# Altium footprint library First Board IMX6.PcbLib: 204 footprints (part 9 of 13)
Each footprint in its own frame and in the unit in brackets; x right, y up, seen from the top. Pads: shape width x height; smd on the part's side, far side on the other; paste and mask are expansions set on the pad; w line width, h text height; cw(c..) or ccw(c..) is an arc to the next point about the centre after c.
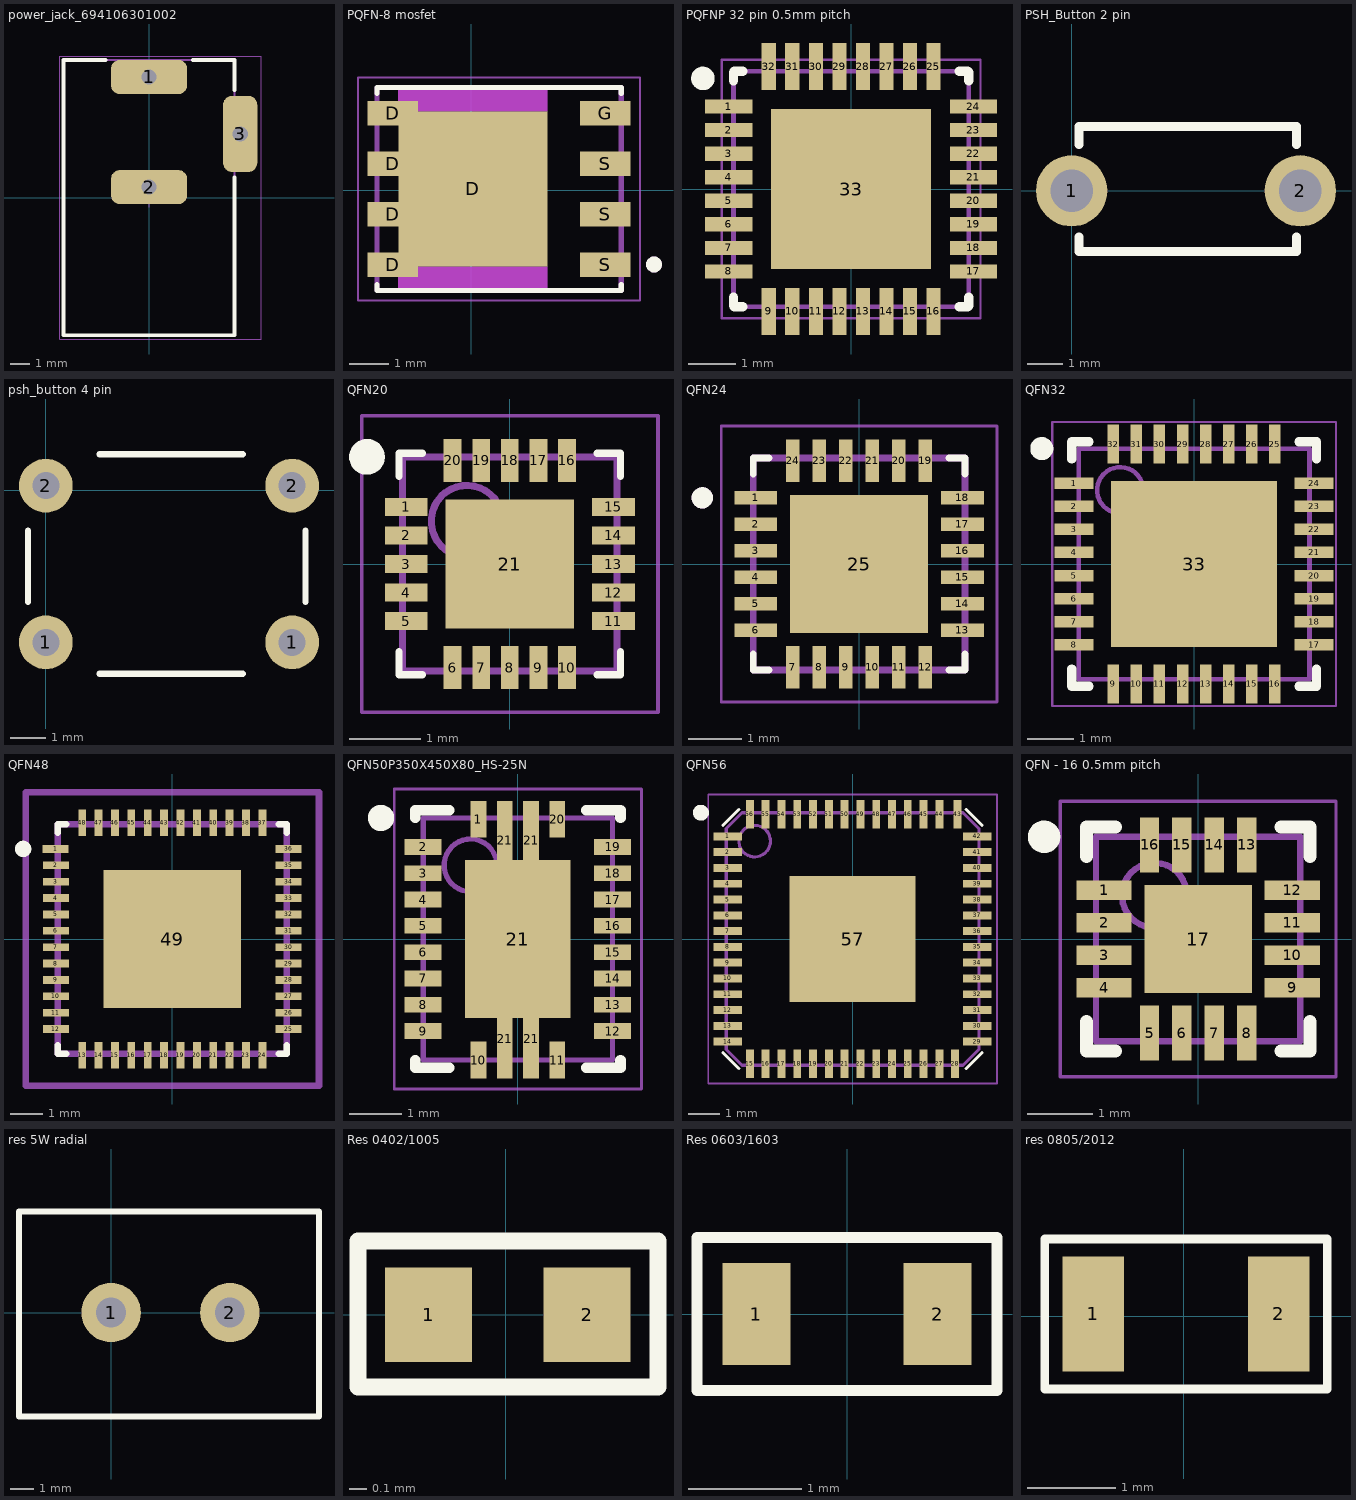
[diagram p8: the footprints below, top view; thin cyan lines are the x and y axes]

## power_jack_694106301002 [mm]
pads (3):
  rrect50% 4x1.8 hole 0.8 square: 1(0,6.35) 2(0,0.55)
  rrect50% 1.8x4 hole 0.8 square: 3(4.8,3.35)
Top Overlay:
  lines w0.2: -2.3,7.25 -4.5,7.25 -4.5,-7.25 4.5,-7.25 4.5,1.05 ; 2.3,7.25 4.5,7.25 4.5,5.65
Mechanical 11:
  lines w0.1: -4.5,-7.25 4.5,-7.25 4.5,7.25 -4.5,7.25 -4.5,-7.25
  text ".Designator" at -1.75,-0.75 h1.5
Mechanical 13:
  lines w0.1: -4.5,-7.25 -4.5,7.25 4.5,7.25 4.5,-7.25 -4.5,-7.25
Mechanical 15:
  lines w0.05: -0.5,0 0.5,0 ; 0,-0.5 0,0.5 ; -4.7,-7.45 5.9,-7.45 5.9,7.45 -4.7,7.45 -4.7,-7.45
3D body "694106301002.stp": height 10.75, standoff -3.75, extent -4.5,-7.25 5,7.25

## PQFN-8 mosfet [mm]
pads (9):
  rect 1.27x0.61 smd: D(-1.97,-1.878) D(-1.97,-0.608) D(-1.97,0.662) D(-1.97,1.932) G(3.37,1.932) S(3.37,-1.878) S(3.37,-0.608) S(3.37,0.662)
  rect 3.75x3.91 smd: D(0.04,0.027)
Top Overlay:
  circle w0.2: c4.6,-1.873 r0.1
  lines w0.127: -2.375,-2.373 -2.375,-2.523 3.775,-2.523 3.775,-2.373 ; -2.375,2.427 -2.375,2.577 3.775,2.577 3.775,2.427
Keep-Out Layer:
  region: -1.335,-1.931 1.912,-1.931 1.912,-2.523 -1.335,-2.523
  region: -1.835,-2.174 -1.331,-2.174 -1.331,-2.523 -1.835,-2.523
  region: -1.335,2.581 1.917,2.581 1.917,1.982 -1.335,1.982
  region: -1.84,2.589 -1.336,2.589 -1.336,2.237 -1.84,2.237
Mechanical 13:
  circle w0.2: c4.6,-1.873 r0.1
  lines w0.127: -2.375,-2.523 3.775,-2.523 3.775,2.577 -2.375,2.577 -2.375,-2.523
Mechanical 15:
  region: -1.335,-1.929 1.91,-1.929 1.91,-2.523 -1.335,-2.523
  region: -1.835,-2.174 -1.331,-2.174 -1.331,-2.523 -1.835,-2.523
  region: -1.335,2.58 1.916,2.58 1.916,1.982 -1.335,1.982
  region: -1.84,2.589 -1.336,2.589 -1.336,2.237 -1.84,2.237
  lines w0.05: -2.85,-2.773 4.25,-2.773 4.25,2.827 -2.85,2.827 -2.85,-2.773
3D body "PQFN-8.step": height 1.1, standoff 0, extent -2.4,-2.6 3.85,2.6

## PQFNP 32 pin 0.5mm pitch [mm] "PQFN, 32-Leads, Body 5,00x5,00mm, Pitch 0,50mm, Thermal Pad 3,80x3,80mm, IPC Medium Density"
height 1
pads (33):
  rect 1x0.3 smd: 1(-2.6,1.75) 2(-2.6,1.25) 3(-2.6,0.75) 4(-2.6,0.25) 5(-2.6,-0.25) 6(-2.6,-0.75) 7(-2.6,-1.25) 8(-2.6,-1.75) 17(2.6,-1.75) 18(2.6,-1.25) 19(2.6,-0.75) 20(2.6,-0.25) 21(2.6,0.25) 22(2.6,0.75) 23(2.6,1.25) 24(2.6,1.75)
  rect 0.3x1 smd: 9(-1.75,-2.6) 10(-1.25,-2.6) 11(-0.75,-2.6) 12(-0.25,-2.6) 13(0.25,-2.6) 14(0.75,-2.6) 15(1.25,-2.6) 16(1.75,-2.6) 25(1.75,2.6) 26(1.25,2.6) 27(0.75,2.6) 28(0.25,2.6) 29(-0.25,2.6) 30(-0.75,2.6) 31(-1.25,2.6) 32(-1.75,2.6)
  rect 3.4x3.4 smd: 33(0,0)
Top Overlay:
  circle w0.25: c-3.15,2.35 r0.125
  lines w0.2: -2.5,-2.3 -2.5,-2.48 -2.48,-2.5 -2.3,-2.5 ; -2.5,2.3 -2.5,2.48 -2.48,2.5 -2.3,2.5 ; 2.3,-2.5 2.48,-2.5 2.5,-2.48 2.5,-2.3 ; 2.3,2.5 2.48,2.5 2.5,2.48 2.5,2.3
Mechanical 13:
  lines w0.1: -2.5,-2.48 -2.5,2.48 -2.48,2.5 2.48,2.5 2.5,2.48 2.5,-2.48 2.48,-2.5 -2.48,-2.5 -2.5,-2.48
Mechanical 15:
  lines w0.05: -2.75,-2.75 2.75,-2.75 2.75,2.75 -2.75,2.75 -2.75,-2.75
  lines w0.1: -0.5,0 0.5,0 ; 0,-0.5 0,0.5
3D body "UFQFPN-32.step": height 0.55, standoff 0, extent -2.5,-2.5 2.5,2.5

## PSH_Button 2 pin [mm]
pads (2):
  round 2 hole 1.2 mask+0.1: 1(0,0) 2(6.4,0)
Top Overlay:
  lines w0.254: 0.2,-1.3 0.2,-1.7 6.3,-1.7 6.3,-1.3 ; 0.2,1.3 0.2,1.8 6.3,1.8 6.3,1.3

## psh_button 4 pin [mil]
pads (4):
  round 60 hole 30: 1(0,-170) 1(275,-170) 2(0,5) 2(275,5)
Top Overlay:
  lines w7: -20,-125 -20,-45 ; 60,-205 220,-205 ; 60,40 220,40 ; 290,-125 290,-45
3D body "Psh_Button.step": height 98.43, standoff -314.96, extent -20.51,-204.1 290.51,40

## QFN20 [mm] "QFN, 20-Leads, Body 3,00x3,00mm, Pitch 0,40mm, Thermal Pad 1,80x1,80mm, IPC Medium Density"
height 0.8
pads (21):
  rect 0.6x0.25 smd: 1(-1.45,0.8) 2(-1.45,0.4) 3(-1.45,0) 4(-1.45,-0.4) 5(-1.45,-0.8) 11(1.45,-0.8) 12(1.45,-0.4) 13(1.45,0) 14(1.45,0.4) 15(1.45,0.8)
  rect 0.25x0.6 smd: 6(-0.8,-1.45) 7(-0.4,-1.45) 8(0,-1.45) 9(0.4,-1.45) 10(0.8,-1.45) 16(0.8,1.45) 17(0.4,1.45) 18(0,1.45) 19(-0.4,1.45) 20(-0.8,1.45)
  rect 1.8x1.8 smd: 21(0,0)
Top Overlay:
  circle w0.25: c-2,1.5 r0.125
  lines w0.1: -1.55,-1.225 -1.55,-1.55 -1.225,-1.55 ; -1.55,1.225 -1.55,1.55 -1.225,1.55 ; 1.225,-1.55 1.55,-1.55 1.55,-1.225 ; 1.225,1.55 1.55,1.55 1.55,1.225
Top Assembly:
  circle w0.1: c-0.6,0.6 r0.5
  lines w0.1: -1.5,-1.5 -1.5,1.5 1.5,1.5 1.5,-1.5 -1.5,-1.5
Top Courtyard:
  lines w0.05: -2.075,-2.075 -2.075,2.075 2.075,2.075 2.075,-2.075 -2.075,-2.075
  lines w0.1: -0.5,0 0.5,0 ; 0,-0.5 0,0.5
3D body "QFN-20-1EP_3x3mm_P0.45mm_EP1.6x1.6mm.step": height 0.6, standoff 0, extent -1.5,-1.5 1.5,1.5

## QFN24 [mm]
pads (25):
  rect 0.81x0.26 smd: 1(-1.95,1.25) 2(-1.95,0.75) 3(-1.95,0.25) 4(-1.95,-0.25) 5(-1.95,-0.75) 6(-1.95,-1.25) 13(1.95,-1.25) 14(1.95,-0.75) 15(1.95,-0.25) 16(1.95,0.25) 17(1.95,0.75) 18(1.95,1.25)
  rect 0.26x0.81 smd: 7(-1.25,-1.95) 8(-0.75,-1.95) 9(-0.25,-1.95) 10(0.25,-1.95) 11(0.75,-1.95) 12(1.25,-1.95) 19(1.25,1.95) 20(0.75,1.95) 21(0.25,1.95) 22(-0.25,1.95) 23(-0.75,1.95) 24(-1.25,1.95)
  rect 2.6x2.6 smd paste-2: 25(0,0)
Top Overlay:
  circle w0.2: c-2.96,1.25 r0.1
  lines w0.127: -2,-1.7 -2,-2 -1.7,-2 ; -2,1.7 -2,2 -1.7,2 ; 1.7,-2 2,-2 2,-1.7 ; 1.7,2 2,2 2,1.7
Top Paste:
  region: 0.82,-0.82 -0.82,-0.82 -0.82,0.82 0.82,0.82
Mechanical 13:
  circle w0.2: c-2.96,1.25 r0.1
  lines w0.127: -2,-2 2,-2 2,2 -2,2 -2,-2
Mechanical 15:
  lines w0.05: -2.605,-2.605 2.605,-2.605 2.605,2.605 -2.605,2.605 -2.605,-2.605
3D body "QFN 24 4x4.step": height -0.4, standoff -1.3, extent -2.002,-2.002 2.002,2.002

## QFN32 [mm] "QFN, 32-Leads, Body 5,00x5,00mm, Pitch 0,50mm, Thermal Pad 3,60x3,60mm, IPC Medium Density"
height 0.8
pads (33):
  rect 0.85x0.25 smd: 1(-2.6,1.75) 2(-2.6,1.25) 3(-2.6,0.75) 4(-2.6,0.25) 5(-2.6,-0.25) 6(-2.6,-0.75) 7(-2.6,-1.25) 8(-2.6,-1.75) 17(2.6,-1.75) 18(2.6,-1.25) 19(2.6,-0.75) 20(2.6,-0.25) 21(2.6,0.25) 22(2.6,0.75) 23(2.6,1.25) 24(2.6,1.75)
  rect 0.25x0.85 smd: 9(-1.75,-2.6) 10(-1.25,-2.6) 11(-0.75,-2.6) 12(-0.25,-2.6) 13(0.25,-2.6) 14(0.75,-2.6) 15(1.25,-2.6) 16(1.75,-2.6) 25(1.75,2.6) 26(1.25,2.6) 27(0.75,2.6) 28(0.25,2.6) 29(-0.25,2.6) 30(-0.75,2.6) 31(-1.25,2.6) 32(-1.75,2.6)
  rect 3.6x3.6 smd: 33(0,0)
Top Overlay:
  circle w0.25: c-3.3,2.5 r0.125
  lines w0.2: -2.65,-2.275 -2.65,-2.65 -2.275,-2.65 ; -2.65,2.275 -2.65,2.65 -2.275,2.65 ; 2.275,-2.65 2.65,-2.65 2.65,-2.275 ; 2.275,2.65 2.65,2.65 2.65,2.275
Top Assembly:
  circle w0.1: c-1.6,1.6 r0.5
  lines w0.1: -2.5,-2.5 -2.5,2.5 2.5,2.5 2.5,-2.5 -2.5,-2.5
Top Courtyard:
  lines w0.05: -3.075,-3.075 -3.075,3.075 3.075,3.075 3.075,-3.075 -3.075,-3.075
  lines w0.1: -0.5,0 0.5,0 ; 0,-0.5 0,0.5
3D body: height 0.8, standoff 0.01, extent -2.5,-2.5 2.5,2.5

## QFN48 [mm]
pads (49):
  rect 0.8x0.239 smd paste+0: 1(-3.563,2.75) 2(-3.551,2.25) 3(-3.551,1.75) 4(-3.551,1.25) 5(-3.551,0.75) 6(-3.551,0.25) 7(-3.551,-0.25) 8(-3.551,-0.75) 9(-3.551,-1.25) 10(-3.551,-1.75) 11(-3.551,-2.25) 12(-3.551,-2.75) 25(3.551,-2.75) 26(3.551,-2.25) 27(3.551,-1.75) 28(3.551,-1.25) 29(3.551,-0.75) 30(3.551,-0.25) 31(3.551,0.25) 32(3.551,0.75) 33(3.551,1.25) 34(3.551,1.75) 35(3.551,2.25) 36(3.551,2.75)
  rect 0.239x0.8 smd paste+0: 13(-2.75,-3.551) 14(-2.25,-3.551) 15(-1.75,-3.551) 16(-1.25,-3.551) 17(-0.75,-3.551) 18(-0.25,-3.551) 19(0.25,-3.551) 20(0.75,-3.551) 21(1.25,-3.551) 22(1.75,-3.551) 23(2.25,-3.551) 24(2.75,-3.551) 37(2.75,3.551) 38(2.25,3.551) 39(1.75,3.551) 40(1.25,3.551) 41(0.75,3.551) 42(0.25,3.551) 43(-0.25,3.551) 44(-0.75,3.551) 45(-1.25,3.551) 46(-1.75,3.551) 47(-2.25,3.551) 48(-2.75,3.551)
  rect 4.2x4.2 smd paste-1000 mask+0: 49(0,0)
Top Overlay:
  circle w0.25: c-4.554,2.75 r0.125
  lines w0.2: -3.5,-3.245 -3.5,-3.5 -3.245,-3.5 ; -3.5,3.245 -3.5,3.5 -3.245,3.5 ; 3.245,-3.5 3.5,-3.5 3.5,-3.245 ; 3.245,3.5 3.5,3.5 3.5,3.245
Top Paste:
  rectangle: -1.328,-1.328 1.328,1.328
Mechanical 10:
  lines w0.2: -4.479,-4.479 4.479,-4.479 4.479,4.479 -4.479,4.479 -4.479,-4.479
  text ".Designator" at -4.5,4.888 h1
Bottom Assembly:
  lines w0.2: -3.5,-3.5 3.5,-3.5 3.5,3.5 -3.5,3.5 -3.5,-3.5
Mechanical 15:
  lines w0.1: -0.5,0 0.5,0 ; 0,-0.5 0,0.5
  lines w0.2: -4.479,-4.479 4.479,-4.479 4.479,4.479 -4.479,4.479 -4.479,-4.479
3D body "IC_Texas_Instruments_DP83869HMRGZT_eec.STEP": height 1.02, standoff 0.01, extent -3.5,-3.5 3.5,3.5

## QFN50P350X450X80_HS-25N [mm] "QFN, 24-Leads, Body 3,50x4,50mm, Pitch 0,50mm, Thermal Pad 2,00x3,00mm, IPC Medium Density"
height 0.8
pads (25):
  rect 0.3x0.7 smd: 1(-0.75,2.275) 10(-0.75,-2.3) 11(0.75,-2.3) 20(0.75,2.275)
  rect 0.7x0.3 smd: 2(-1.8,1.75) 3(-1.8,1.25) 4(-1.8,0.75) 5(-1.8,0.25) 6(-1.8,-0.25) 7(-1.8,-0.75) 8(-1.8,-1.25) 9(-1.8,-1.75) 12(1.8,-1.75) 13(1.8,-1.25) 14(1.8,-0.75) 15(1.8,-0.25) 16(1.8,0.25) 17(1.8,0.75) 18(1.8,1.25) 19(1.8,1.75)
  rect 0.3x1.5 smd: 21(-0.25,-1.9) 21(-0.25,1.875) 21(0.25,-1.9) 21(0.25,1.875)
  rect 2x3 smd: 21(0,0)
Top Overlay:
  circle w0.25: c-2.6,2.3 r0.125
  lines w0.2: -1.95,-2.3 -1.95,-2.45 -1.3,-2.45 ; -1.95,2.3 -1.95,2.45 -1.3,2.45 ; 1.3,-2.45 1.95,-2.45 1.95,-2.3 ; 1.3,2.45 1.95,2.45 1.95,2.3
Mechanical 13:
  circle w0.1: c-0.9,1.4 r0.5
  lines w0.1: -1.8,-2.3 -1.8,2.3 1.8,2.3 1.8,-2.3 -1.8,-2.3
Mechanical 15:
  lines w0.05: -2.35,-2.85 -2.35,2.85 2.35,2.85 2.35,-2.85 -2.35,-2.85
  lines w0.1: -0.5,0 0.5,0 ; 0,-0.5 0,0.5
3D body: height 0.8, standoff 0.01, extent -1.8,-2.3 1.8,2.3

## QFN56 [mm]
pads (57):
  rect 0.9x0.25 smd: 1(-3.95,3.25) 2(-3.95,2.75) 3(-3.95,2.25) 4(-3.95,1.75) 5(-3.95,1.25) 6(-3.95,0.75) 7(-3.95,0.25) 8(-3.95,-0.25) 9(-3.95,-0.75) 10(-3.95,-1.25) 11(-3.95,-1.75) 12(-3.95,-2.25) 13(-3.95,-2.75) 14(-3.95,-3.25) 29(3.95,-3.25) 30(3.95,-2.75) 31(3.95,-2.25) 32(3.95,-1.75) 33(3.95,-1.25) 34(3.95,-0.75) 35(3.95,-0.25) 36(3.95,0.25) 37(3.95,0.75) 38(3.95,1.25) 39(3.95,1.75) 40(3.95,2.25) 41(3.95,2.75) 42(3.95,3.25)
  rect 0.25x0.9 smd: 15(-3.25,-3.95) 16(-2.75,-3.95) 17(-2.25,-3.95) 18(-1.75,-3.95) 19(-1.25,-3.95) 20(-0.75,-3.95) 21(-0.25,-3.95) 22(0.25,-3.95) 23(0.75,-3.95) 24(1.25,-3.95) 25(1.75,-3.95) 26(2.25,-3.95) 27(2.75,-3.95) 28(3.25,-3.95) 43(3.325,3.95) 44(2.75,3.95) 45(2.25,3.95) 46(1.75,3.95) 47(1.25,3.95) 48(0.75,3.95) 49(0.25,3.95) 50(-0.25,3.95) 51(-0.75,3.95) 52(-1.25,3.95) 53(-1.75,3.95) 54(-2.25,3.95) 55(-2.75,3.95) 56(-3.25,3.95)
  rect 4x4 smd: 57(0,0)
Top Overlay:
  circle w0.25: c-4.8,4 r0.125
  lines w0.1: -4.1,-3.6 -3.6,-4.1 ; -4.1,3.6 -3.6,4.1 ; 3.6,-4.1 4.1,-3.6 ; 3.6,4.1 4.1,3.6
Top Assembly:
  circle w0.1: c-3.1,3.1 r0.5
  lines w0.1: -4,-3.5 -4,3.5 -3.5,4 3.5,4 4,3.5 4,-3.5 3.5,-4 -3.5,-4 -4,-3.5
Top Courtyard:
  lines w0.05: -4.575,-4.575 4.575,-4.575 4.575,4.575 -4.575,4.575 -4.575,-4.575
  lines w0.1: -0.5,0 0.5,0 ; 0,-0.5 0,0.5
3D body "QFN56 (8x8).x_t": height 0.95, standoff 0, extent -4.005,-3.99 4.025,4.04

## QFN - 16 0.5mm pitch [mm]
pads (17):
  rect 0.85x0.3 smd: 1(-1.45,0.75) 2(-1.45,0.25) 3(-1.45,-0.25) 4(-1.45,-0.75) 9(1.45,-0.75) 10(1.45,-0.25) 11(1.45,0.25) 12(1.45,0.75)
  rect 0.3x0.85 smd: 5(-0.75,-1.45) 6(-0.25,-1.45) 7(0.25,-1.45) 8(0.75,-1.45) 13(0.75,1.45) 14(0.25,1.45) 15(-0.25,1.45) 16(-0.75,1.45)
  rect 1.66x1.66 smd: 17(0,0)
Top Overlay:
  circle w0.25: c-2.375,1.575 r0.125
  lines w0.2: -1.725,-1.275 -1.725,-1.725 -1.275,-1.725 ; -1.725,1.275 -1.725,1.725 -1.275,1.725 ; 1.275,-1.725 1.725,-1.725 1.725,-1.275 ; 1.275,1.725 1.725,1.725 1.725,1.275
Mechanical 13:
  circle w0.1: c-0.675,0.675 r0.5
  lines w0.1: -1.575,-1.575 1.575,-1.575 1.575,1.575 -1.575,1.575 -1.575,-1.575
Mechanical 15:
  lines w0.05: -2.125,-2.125 2.125,-2.125 2.125,2.125 -2.125,2.125 -2.125,-2.125
  lines w0.1: -0.5,0 0.5,0 ; 0,-0.5 0,0.5
3D body: height 0.8, standoff 0.01, extent -1.575,-1.575 1.575,1.575

## res 5W radial [mm]
pads (2):
  round 2.54 hole 1.27: 1(0,0) 2(5.08,0)
Top Overlay:
  lines w0.254: -3.937,-4.445 -3.937,4.318 8.89,4.318 8.89,-4.445 -3.937,-4.445
3D body "RES-5w.step": height 25, standoff -3.5, extent -3.96,-4.555 9.04,4.445

## Res 0402/1005 [mm]
pads (2):
  rect 0.508x0.55 smd mask+0.07: 1(-0.45,0) 2(0.475,0)
Top Overlay:
  lines w0.1: -0.862,-0.421 -0.862,0.429 0.888,0.429 0.888,-0.421 -0.862,-0.421
3D body "0402.step": height 0.35, standoff 0, extent -0.475,-0.25 0.525,0.25

## Res 0603/1603 [mm]
pads (2):
  rect 0.6x0.9 smd: 1(-0.8,0) 2(0.8,0)
Top Overlay:
  lines w0.1: -1.325,-0.675 -1.325,0.675 1.225,0.675 1.325,0.675 1.325,-0.675 -1.325,-0.675
3D body "0603.step": height 0.45, standoff 0, extent -0.8,-0.4 0.8,0.4

## res 0805/2012 [mm]
pads (2):
  rect 0.7x1.3 smd: 1(-1.025,0.025) 2(1.075,0.025)
Top Overlay:
  lines w0.1: -1.575,-0.825 -1.575,0.875 1.625,0.875 1.625,-0.825 -1.575,-0.825
3D body "0805.step": height 0.58, standoff 0.03, extent -1.025,-0.6 0.975,0.65